# Altium footprint library ref-packages-longpad.PCBLIB: 1527 footprints (part 78 of 103) (continued)
## SQFP-S-20X20-192 [mm] (continued)
Top Overlay:
  circle w0.254: c-8.5,-8.5 r0.75
  lines w0.203: -9.72,-9.71 9.71,-9.71 9.71,9.71 -9.72,9.71 -9.72,-9.71
Mechanical 16:
  drawing of 196 lines, arcs and shapes, not listed
Mechanical 27:
  lines w0.2: -11.9,-11.9 -11.9,11.9 11.9,11.9 11.9,-11.9 -11.9,-11.9

## SQFP-S-20X20-248 [mm]
pads (248):
  rect 0.17x1.6 smd: 1(-9.15,-10.45) 2(-8.85,-10.45) 3(-8.55,-10.45) 4(-8.25,-10.45) 5(-7.95,-10.45) 6(-7.65,-10.45) 7(-7.35,-10.45) 8(-7.05,-10.45) 9(-6.75,-10.45) 10(-6.45,-10.45) 11(-6.15,-10.45) 12(-5.85,-10.45) 13(-5.55,-10.45) 14(-5.25,-10.45) 15(-4.95,-10.45) 16(-4.65,-10.45) 17(-4.35,-10.45) 18(-4.05,-10.45) 19(-3.75,-10.45) 20(-3.45,-10.45) 21(-3.15,-10.45) 22(-2.85,-10.45) 23(-2.55,-10.45) 24(-2.25,-10.45) 25(-1.95,-10.45) 26(-1.65,-10.45) 27(-1.35,-10.45) 28(-1.05,-10.45) 29(-0.75,-10.45) 30(-0.45,-10.45) 31(-0.15,-10.45) 32(0.15,-10.45) 33(0.45,-10.45) 34(0.75,-10.45) 35(1.05,-10.45) 36(1.35,-10.45) 37(1.65,-10.45) 38(1.95,-10.45) 39(2.25,-10.45) 40(2.55,-10.45) 41(2.85,-10.45) 42(3.15,-10.45) 43(3.45,-10.45) 44(3.75,-10.45) 45(4.05,-10.45) 46(4.35,-10.45) 47(4.65,-10.45) 48(4.95,-10.45) 49(5.25,-10.45) 50(5.55,-10.45) 51(5.85,-10.45) 52(6.15,-10.45) 53(6.45,-10.45) 54(6.75,-10.45) 55(7.05,-10.45) 56(7.35,-10.45) 57(7.65,-10.45) 58(7.95,-10.45) 59(8.25,-10.45) 60(8.55,-10.45) 61(8.85,-10.45) 62(9.15,-10.45) 125(9.15,10.45) 126(8.85,10.45) 127(8.55,10.45) 128(8.25,10.45) 129(7.95,10.45) 130(7.65,10.45) 131(7.35,10.45) 132(7.05,10.45) 133(6.75,10.45) 134(6.45,10.45) 135(6.15,10.45) 136(5.85,10.45) 137(5.55,10.45) 138(5.25,10.45) 139(4.95,10.45) 140(4.65,10.45) 141(4.35,10.45) 142(4.05,10.45) 143(3.75,10.45) 144(3.45,10.45) 145(3.15,10.45) 146(2.85,10.45) 147(2.55,10.45) 148(2.25,10.45) 149(1.95,10.45) 150(1.65,10.45) 151(1.35,10.45) 152(1.05,10.45) 153(0.75,10.45) 154(0.45,10.45) 155(0.15,10.45) 156(-0.15,10.45) 157(-0.45,10.45) 158(-0.75,10.45) 159(-1.05,10.45) 160(-1.35,10.45) 161(-1.65,10.45) 162(-1.95,10.45) 163(-2.25,10.45) 164(-2.55,10.45) 165(-2.85,10.45) 166(-3.15,10.45) 167(-3.45,10.45) 168(-3.75,10.45) 169(-4.05,10.45) 170(-4.35,10.45) 171(-4.65,10.45) 172(-4.95,10.45) 173(-5.25,10.45) 174(-5.55,10.45) 175(-5.85,10.45) 176(-6.15,10.45) 177(-6.45,10.45) 178(-6.75,10.45) 179(-7.05,10.45) 180(-7.35,10.45) 181(-7.65,10.45) 182(-7.95,10.45) 183(-8.25,10.45) 184(-8.55,10.45) 185(-8.85,10.45) 186(-9.15,10.45)
  rect 1.6x0.17 smd: 63(10.45,-9.15) 64(10.45,-8.85) 65(10.45,-8.55) 66(10.45,-8.25) 67(10.45,-7.95) 68(10.45,-7.65) 69(10.45,-7.35) 70(10.45,-7.05) 71(10.45,-6.75) 72(10.45,-6.45) 73(10.45,-6.15) 74(10.45,-5.85) 75(10.45,-5.55) 76(10.45,-5.25) 77(10.45,-4.95) 78(10.45,-4.65) 79(10.45,-4.35) 80(10.45,-4.05) 81(10.45,-3.75) 82(10.45,-3.45) 83(10.45,-3.15) 84(10.45,-2.85) 85(10.45,-2.55) 86(10.45,-2.25) 87(10.45,-1.95) 88(10.45,-1.65) 89(10.45,-1.35) 90(10.45,-1.05) 91(10.45,-0.75) 92(10.45,-0.45) 93(10.45,-0.15) 94(10.45,0.15) 95(10.45,0.45) 96(10.45,0.75) 97(10.45,1.05) 98(10.45,1.35) 99(10.45,1.65) 100(10.45,1.95) 101(10.45,2.25) 102(10.45,2.55) 103(10.45,2.85) 104(10.45,3.15) 105(10.45,3.45) 106(10.45,3.75) 107(10.45,4.05) 108(10.45,4.35) 109(10.45,4.65) 110(10.45,4.95) 111(10.45,5.25) 112(10.45,5.55) 113(10.45,5.85) 114(10.45,6.15) 115(10.45,6.45) 116(10.45,6.75) 117(10.45,7.05) 118(10.45,7.35) 119(10.45,7.65) 120(10.45,7.95) 121(10.45,8.25) 122(10.45,8.55) 123(10.45,8.85) 124(10.45,9.15) 187(-10.45,9.15) 188(-10.45,8.85) 189(-10.45,8.55) 190(-10.45,8.25) 191(-10.45,7.95) 192(-10.45,7.65) 193(-10.45,7.35) 194(-10.45,7.05) 195(-10.45,6.75) 196(-10.45,6.45) 197(-10.45,6.15) 198(-10.45,5.85) 199(-10.45,5.55) 200(-10.45,5.25) 201(-10.45,4.95) 202(-10.45,4.65) 203(-10.45,4.35) 204(-10.45,4.05) 205(-10.45,3.75) 206(-10.45,3.45) 207(-10.45,3.15) 208(-10.45,2.85) 209(-10.45,2.55) 210(-10.45,2.25) 211(-10.45,1.95) 212(-10.45,1.65) 213(-10.45,1.35) 214(-10.45,1.05) 215(-10.45,0.75) 216(-10.45,0.45) 217(-10.45,0.15) 218(-10.45,-0.15) 219(-10.45,-0.45) 220(-10.45,-0.75) 221(-10.45,-1.05) 222(-10.45,-1.35) 223(-10.45,-1.65) 224(-10.45,-1.95) 225(-10.45,-2.25) 226(-10.45,-2.55) 227(-10.45,-2.85) 228(-10.45,-3.15) 229(-10.45,-3.45) 230(-10.45,-3.75) 231(-10.45,-4.05) 232(-10.45,-4.35) 233(-10.45,-4.65) 234(-10.45,-4.95) 235(-10.45,-5.25) 236(-10.45,-5.55) 237(-10.45,-5.85) 238(-10.45,-6.15) 239(-10.45,-6.45) 240(-10.45,-6.75) 241(-10.45,-7.05) 242(-10.45,-7.35) 243(-10.45,-7.65) 244(-10.45,-7.95) 245(-10.45,-8.25) 246(-10.45,-8.55) 247(-10.45,-8.85) 248(-10.45,-9.15)
Top Overlay:
  circle w0.254: c-8.5,-8.5 r0.75
  lines w0.203: -9.72,-9.71 9.71,-9.71 9.71,9.71 -9.72,9.71 -9.72,-9.71
Mechanical 16:
  drawing of 252 lines, arcs and shapes, not listed
Mechanical 27:
  lines w0.2: -11.9,-11.9 -11.9,11.9 11.9,11.9 11.9,-11.9 -11.9,-11.9

## SQFP-S-20X20-256 [mm]
pads (256):
  rect 0.17x1.6 smd: 1(-9.45,-10.6) 2(-9.15,-10.6) 3(-8.85,-10.6) 4(-8.55,-10.6) 5(-8.25,-10.6) 6(-7.95,-10.6) 7(-7.65,-10.6) 8(-7.35,-10.6) 9(-7.05,-10.6) 10(-6.75,-10.6) 11(-6.45,-10.6) 12(-6.15,-10.6) 13(-5.85,-10.6) 14(-5.55,-10.6) 15(-5.25,-10.6) 16(-4.95,-10.6) 17(-4.65,-10.6) 18(-4.35,-10.6) 19(-4.05,-10.6) 20(-3.75,-10.6) 21(-3.45,-10.6) 22(-3.15,-10.6) 23(-2.85,-10.6) 24(-2.55,-10.6) 25(-2.25,-10.6) 26(-1.95,-10.6) 27(-1.65,-10.6) 28(-1.35,-10.6) 29(-1.05,-10.6) 30(-0.75,-10.6) 31(-0.45,-10.6) 32(-0.15,-10.6) 33(0.15,-10.6) 34(0.45,-10.6) 35(0.75,-10.6) 36(1.05,-10.6) 37(1.35,-10.6) 38(1.65,-10.6) 39(1.95,-10.6) 40(2.25,-10.6) 41(2.55,-10.6) 42(2.85,-10.6) 43(3.15,-10.6) 44(3.45,-10.6) 45(3.75,-10.6) 46(4.05,-10.6) 47(4.35,-10.6) 48(4.65,-10.6) 49(4.95,-10.6) 50(5.25,-10.6) 51(5.55,-10.6) 52(5.85,-10.6) 53(6.15,-10.6) 54(6.45,-10.6) 55(6.75,-10.6) 56(7.05,-10.6) 57(7.35,-10.6) 58(7.65,-10.6) 59(7.95,-10.6) 60(8.25,-10.6) 61(8.55,-10.6) 62(8.85,-10.6) 63(9.15,-10.6) 64(9.45,-10.6) 129(9.45,10.6) 130(9.15,10.6) 131(8.85,10.6) 132(8.55,10.6) 133(8.25,10.6) 134(7.95,10.6) 135(7.65,10.6) 136(7.35,10.6) 137(7.05,10.6) 138(6.75,10.6) 139(6.45,10.6) 140(6.15,10.6) 141(5.85,10.6) 142(5.55,10.6) 143(5.25,10.6) 144(4.95,10.6) 145(4.65,10.6) 146(4.35,10.6) 147(4.05,10.6) 148(3.75,10.6) 149(3.45,10.6) 150(3.15,10.6) 151(2.85,10.6) 152(2.55,10.6) 153(2.25,10.6) 154(1.95,10.6) 155(1.65,10.6) 156(1.35,10.6) 157(1.05,10.6) 158(0.75,10.6) 159(0.45,10.6) 160(0.15,10.6) 161(-0.15,10.6) 162(-0.45,10.6) 163(-0.75,10.6) 164(-1.05,10.6) 165(-1.35,10.6) 166(-1.65,10.6) 167(-1.95,10.6) 168(-2.25,10.6) 169(-2.55,10.6) 170(-2.85,10.6) 171(-3.15,10.6) 172(-3.45,10.6) 173(-3.75,10.6) 174(-4.05,10.6) 175(-4.35,10.6) 176(-4.65,10.6) 177(-4.95,10.6) 178(-5.25,10.6) 179(-5.55,10.6) 180(-5.85,10.6) 181(-6.15,10.6) 182(-6.45,10.6) 183(-6.75,10.6) 184(-7.05,10.6) 185(-7.35,10.6) 186(-7.65,10.6) 187(-7.95,10.6) 188(-8.25,10.6) 189(-8.55,10.6) 190(-8.85,10.6) 191(-9.15,10.6) 192(-9.45,10.6)
  rect 1.6x0.17 smd: 65(10.6,-9.45) 66(10.6,-9.15) 67(10.6,-8.85) 68(10.6,-8.55) 69(10.6,-8.25) 70(10.6,-7.95) 71(10.6,-7.65) 72(10.6,-7.35) 73(10.6,-7.05) 74(10.6,-6.75) 75(10.6,-6.45) 76(10.6,-6.15) 77(10.6,-5.85) 78(10.6,-5.55) 79(10.6,-5.25) 80(10.6,-4.95) 81(10.6,-4.65) 82(10.6,-4.35) 83(10.6,-4.05) 84(10.6,-3.75) 85(10.6,-3.45) 86(10.6,-3.15) 87(10.6,-2.85) 88(10.6,-2.55) 89(10.6,-2.25) 90(10.6,-1.95) 91(10.6,-1.65) 92(10.6,-1.35) 93(10.6,-1.05) 94(10.6,-0.75) 95(10.6,-0.45) 96(10.6,-0.15) 97(10.6,0.15) 98(10.6,0.45) 99(10.6,0.75) 100(10.6,1.05) 101(10.6,1.35) 102(10.6,1.65) 103(10.6,1.95) 104(10.6,2.25) 105(10.6,2.55) 106(10.6,2.85) 107(10.6,3.15) 108(10.6,3.45) 109(10.6,3.75) 110(10.6,4.05) 111(10.6,4.35) 112(10.6,4.65) 113(10.6,4.95) 114(10.6,5.25) 115(10.6,5.55) 116(10.6,5.85) 117(10.6,6.15) 118(10.6,6.45) 119(10.6,6.75) 120(10.6,7.05) 121(10.6,7.35) 122(10.6,7.65) 123(10.6,7.95) 124(10.6,8.25) 125(10.6,8.55) 126(10.6,8.85) 127(10.6,9.15) 128(10.6,9.45) 193(-10.6,9.45) 194(-10.6,9.15) 195(-10.6,8.85) 196(-10.6,8.55) 197(-10.6,8.25) 198(-10.6,7.95) 199(-10.6,7.65) 200(-10.6,7.35) 201(-10.6,7.05) 202(-10.6,6.75) 203(-10.6,6.45) 204(-10.6,6.15) 205(-10.6,5.85) 206(-10.6,5.55) 207(-10.6,5.25) 208(-10.6,4.95) 209(-10.6,4.65) 210(-10.6,4.35) 211(-10.6,4.05) 212(-10.6,3.75) 213(-10.6,3.45) 214(-10.6,3.15) 215(-10.6,2.85) 216(-10.6,2.55) 217(-10.6,2.25) 218(-10.6,1.95) 219(-10.6,1.65) 220(-10.6,1.35) 221(-10.6,1.05) 222(-10.6,0.75) 223(-10.6,0.45) 224(-10.6,0.15) 225(-10.6,-0.15) 226(-10.6,-0.45) 227(-10.6,-0.75) 228(-10.6,-1.05) 229(-10.6,-1.35) 230(-10.6,-1.65) 231(-10.6,-1.95) 232(-10.6,-2.25) 233(-10.6,-2.55) 234(-10.6,-2.85) 235(-10.6,-3.15) 236(-10.6,-3.45) 237(-10.6,-3.75) 238(-10.6,-4.05) 239(-10.6,-4.35) 240(-10.6,-4.65) 241(-10.6,-4.95) 242(-10.6,-5.25) 243(-10.6,-5.55) 244(-10.6,-5.85) 245(-10.6,-6.15) 246(-10.6,-6.45) 247(-10.6,-6.75) 248(-10.6,-7.05) 249(-10.6,-7.35) 250(-10.6,-7.65) 251(-10.6,-7.95) 252(-10.6,-8.25) 253(-10.6,-8.55) 254(-10.6,-8.85) 255(-10.6,-9.15) 256(-10.6,-9.45)
Top Overlay:
  circle w0.254: c-8.5,-8.5 r0.75
  lines w0.203: -9.72,-9.71 9.71,-9.71 9.71,9.71 -9.72,9.71 -9.72,-9.71
Mechanical 16:
  drawing of 260 lines, arcs and shapes, not listed
Mechanical 27:
  lines w0.2: -11.9,-11.9 -11.9,11.9 11.9,11.9 11.9,-11.9 -11.9,-11.9

## SQFP-S-24X24-176 [mil]
pads (176):
  rect 11.81x62.99 smd: 1(-423.23,-496.06) 2(-403.54,-496.06) 3(-383.86,-496.06) 4(-364.17,-496.06) 5(-344.49,-496.06) 6(-324.8,-496.06) 7(-305.12,-496.06) 8(-285.43,-496.06) 9(-265.75,-496.06) 10(-246.06,-496.06) 11(-226.38,-496.06) 12(-206.69,-496.06) 13(-187.01,-496.06) 14(-167.32,-496.06) 15(-147.64,-496.06) 16(-127.95,-496.06) 17(-108.27,-496.06) 18(-88.58,-496.06) 19(-68.9,-496.06) 20(-49.21,-496.06) 21(-29.53,-496.06) 22(-9.84,-496.06) 23(9.84,-496.06) 24(29.53,-496.06) 25(49.21,-496.06) 26(68.9,-496.06) 27(88.58,-496.06) 28(108.27,-496.06) 29(127.95,-496.06) 30(147.64,-496.06) 31(167.32,-496.06) 32(187.01,-496.06) 33(206.69,-496.06) 34(226.38,-496.06) 35(246.06,-496.06) 36(265.75,-496.06) 37(285.43,-496.06) 38(305.12,-496.06) 39(324.8,-496.06) 40(344.49,-496.06) 41(364.17,-496.06) 42(383.86,-496.06) 43(403.54,-496.06) 44(423.23,-496.06) 89(423.23,496.06) 90(403.54,496.06) 91(383.86,496.06) 92(364.17,496.06) 93(344.49,496.06) 94(324.8,496.06) 95(305.12,496.06) 96(285.43,496.06) 97(265.75,496.06) 98(246.06,496.06) 99(226.38,496.06) 100(206.69,496.06) 101(187.01,496.06) 102(167.32,496.06) 103(147.64,496.06) 104(127.95,496.06) 105(108.27,496.06) 106(88.58,496.06) 107(68.9,496.06) 108(49.21,496.06) 109(29.53,496.06) 110(9.84,496.06) 111(-9.84,496.06) 112(-29.53,496.06) 113(-49.21,496.06) 114(-68.9,496.06) 115(-88.58,496.06) 116(-108.27,496.06) 117(-127.95,496.06) 118(-147.64,496.06) 119(-167.32,496.06) 120(-187.01,496.06) 121(-206.69,496.06) 122(-226.38,496.06) 123(-246.06,496.06) 124(-265.75,496.06) 125(-285.43,496.06) 126(-305.12,496.06) 127(-324.8,496.06) 128(-344.49,496.06) 129(-364.17,496.06) 130(-383.86,496.06) 131(-403.54,496.06) 132(-423.23,496.06)
  rect 62.99x11.81 smd: 45(496.06,-423.23) 46(496.06,-403.54) 47(496.06,-383.86) 48(496.06,-364.17) 49(496.06,-344.49) 50(496.06,-324.8) 51(496.06,-305.12) 52(496.06,-285.43) 53(496.06,-265.75) 54(496.06,-246.06) 55(496.06,-226.38) 56(496.06,-206.69) 57(496.06,-187.01) 58(496.06,-167.32) 59(496.06,-147.64) 60(496.06,-127.95) 61(496.06,-108.27) 62(496.06,-88.58) 63(496.06,-68.9) 64(496.06,-49.21) 65(496.06,-29.53) 66(496.06,-9.84) 67(496.06,9.84) 68(496.06,29.53) 69(496.06,49.21) 70(496.06,68.9) 71(496.06,88.58) 72(496.06,108.27) 73(496.06,127.95) 74(496.06,147.64) 75(496.06,167.32) 76(496.06,187.01) 77(496.06,206.69) 78(496.06,226.38) 79(496.06,246.06) 80(496.06,265.75) 81(496.06,285.43) 82(496.06,305.12) 83(496.06,324.8) 84(496.06,344.49) 85(496.06,364.17) 86(496.06,383.86) 87(496.06,403.54) 88(496.06,423.23) 133(-496.06,423.23) 134(-496.06,403.54) 135(-496.06,383.86) 136(-496.06,364.17) 137(-496.06,344.49) 138(-496.06,324.8) 139(-496.06,305.12) 140(-496.06,285.43) 141(-496.06,265.75) 142(-496.06,246.06) 143(-496.06,226.38) 144(-496.06,206.69) 145(-496.06,187.01) 146(-496.06,167.32) 147(-496.06,147.64) 148(-496.06,127.95) 149(-496.06,108.27) 150(-496.06,88.58) 151(-496.06,68.9) 152(-496.06,49.21) 153(-496.06,29.53) 154(-496.06,9.84) 155(-496.06,-9.84) 156(-496.06,-29.53) 157(-496.06,-49.21) 158(-496.06,-68.9) 159(-496.06,-88.58) 160(-496.06,-108.27) 161(-496.06,-127.95) 162(-496.06,-147.64) 163(-496.06,-167.32) 164(-496.06,-187.01) 165(-496.06,-206.69) 166(-496.06,-226.38) 167(-496.06,-246.06) 168(-496.06,-265.75) 169(-496.06,-285.43) 170(-496.06,-305.12) 171(-496.06,-324.8) 172(-496.06,-344.49) 173(-496.06,-364.17) 174(-496.06,-383.86) 175(-496.06,-403.54) 176(-496.06,-423.23)
Top Overlay:
  circle w10: c-413.39,-413.39 r29.53
  lines w8: -461.42,-461.02 461.02,-461.02 461.02,461.02 -461.42,461.02 -461.42,-461.02
Mechanical 16:
  drawing of 180 lines, arcs and shapes, not listed
Mechanical 27:
  lines w7.87: -547.24,-527.56 -547.24,547.24 547.24,547.24 547.24,-527.56 -547.24,-527.56

## SQFP-S-24X24-184 [mil]
pads (184):
  rect 11.81x62.99 smd: 1(-442.91,-496.06) 2(-423.23,-496.06) 3(-403.54,-496.06) 4(-383.86,-496.06) 5(-364.17,-496.06) 6(-344.49,-496.06) 7(-324.8,-496.06) 8(-305.12,-496.06) 9(-285.43,-496.06) 10(-265.75,-496.06) 11(-246.06,-496.06) 12(-226.38,-496.06) 13(-206.69,-496.06) 14(-187.01,-496.06) 15(-167.32,-496.06) 16(-147.64,-496.06) 17(-127.95,-496.06) 18(-108.27,-496.06) 19(-88.58,-496.06) 20(-68.9,-496.06) 21(-49.21,-496.06) 22(-29.53,-496.06) 23(-9.84,-496.06) 24(9.84,-496.06) 25(29.53,-496.06) 26(49.21,-496.06) 27(68.9,-496.06) 28(88.58,-496.06) 29(108.27,-496.06) 30(127.95,-496.06) 31(147.64,-496.06) 32(167.32,-496.06) 33(187.01,-496.06) 34(206.69,-496.06) 35(226.38,-496.06) 36(246.06,-496.06) 37(265.75,-496.06) 38(285.43,-496.06) 39(305.12,-496.06) 40(324.8,-496.06) 41(344.49,-496.06) 42(364.17,-496.06) 43(383.86,-496.06) 44(403.54,-496.06) 45(423.23,-496.06) 46(442.91,-496.06) 93(442.91,496.06) 94(423.23,496.06) 95(403.54,496.06) 96(383.86,496.06) 97(364.17,496.06) 98(344.49,496.06) 99(324.8,496.06) 100(305.12,496.06) 101(285.43,496.06) 102(265.75,496.06) 103(246.06,496.06) 104(226.38,496.06) 105(206.69,496.06) 106(187.01,496.06) 107(167.32,496.06) 108(147.64,496.06) 109(127.95,496.06) 110(108.27,496.06) 111(88.58,496.06) 112(68.9,496.06) 113(49.21,496.06) 114(29.53,496.06) 115(9.84,496.06) 116(-9.84,496.06) 117(-29.53,496.06) 118(-49.21,496.06) 119(-68.9,496.06) 120(-88.58,496.06) 121(-108.27,496.06) 122(-127.95,496.06) 123(-147.64,496.06) 124(-167.32,496.06) 125(-187.01,496.06) 126(-206.69,496.06) 127(-226.38,496.06) 128(-246.06,496.06) 129(-265.75,496.06) 130(-285.43,496.06) 131(-305.12,496.06) 132(-324.8,496.06) 133(-344.49,496.06) 134(-364.17,496.06) 135(-383.86,496.06) 136(-403.54,496.06) 137(-423.23,496.06) 138(-442.91,496.06)
  rect 62.99x11.81 smd: 47(496.06,-442.91) 48(496.06,-423.23) 49(496.06,-403.54) 50(496.06,-383.86) 51(496.06,-364.17) 52(496.06,-344.49) 53(496.06,-324.8) 54(496.06,-305.12) 55(496.06,-285.43) 56(496.06,-265.75) 57(496.06,-246.06) 58(496.06,-226.38) 59(496.06,-206.69) 60(496.06,-187.01) 61(496.06,-167.32) 62(496.06,-147.64) 63(496.06,-127.95) 64(496.06,-108.27) 65(496.06,-88.58) 66(496.06,-68.9) 67(496.06,-49.21) 68(496.06,-29.53) 69(496.06,-9.84) 70(496.06,9.84) 71(496.06,29.53) 72(496.06,49.21) 73(496.06,68.9) 74(496.06,88.58) 75(496.06,108.27) 76(496.06,127.95) 77(496.06,147.64) 78(496.06,167.32) 79(496.06,187.01) 80(496.06,206.69) 81(496.06,226.38) 82(496.06,246.06) 83(496.06,265.75) 84(496.06,285.43) 85(496.06,305.12) 86(496.06,324.8) 87(496.06,344.49) 88(496.06,364.17) 89(496.06,383.86) 90(496.06,403.54) 91(496.06,423.23) 92(496.06,442.91) 139(-496.06,442.91) 140(-496.06,423.23) 141(-496.06,403.54) 142(-496.06,383.86) 143(-496.06,364.17) 144(-496.06,344.49) 145(-496.06,324.8) 146(-496.06,305.12) 147(-496.06,285.43) 148(-496.06,265.75) 149(-496.06,246.06) 150(-496.06,226.38) 151(-496.06,206.69) 152(-496.06,187.01) 153(-496.06,167.32) 154(-496.06,147.64) 155(-496.06,127.95) 156(-496.06,108.27) 157(-496.06,88.58) 158(-496.06,68.9) 159(-496.06,49.21) 160(-496.06,29.53) 161(-496.06,9.84) 162(-496.06,-9.84) 163(-496.06,-29.53) 164(-496.06,-49.21) 165(-496.06,-68.9) 166(-496.06,-88.58) 167(-496.06,-108.27) 168(-496.06,-127.95) 169(-496.06,-147.64) 170(-496.06,-167.32) 171(-496.06,-187.01) 172(-496.06,-206.69) 173(-496.06,-226.38) 174(-496.06,-246.06) 175(-496.06,-265.75) 176(-496.06,-285.43) 177(-496.06,-305.12) 178(-496.06,-324.8) 179(-496.06,-344.49) 180(-496.06,-364.17) 181(-496.06,-383.86) 182(-496.06,-403.54) 183(-496.06,-423.23) 184(-496.06,-442.91)
Top Overlay:
  circle w10: c-413.39,-413.39 r29.53
  lines w8: -461.42,-461.02 461.02,-461.02 461.02,461.02 -461.42,461.02 -461.42,-461.02
Mechanical 16:
  drawing of 188 lines, arcs and shapes, not listed
Mechanical 27:
  lines w7.87: -547.24,-527.56 -547.24,547.24 547.24,547.24 547.24,-527.56 -547.24,-527.56

## SQFP-S-24X24-224 [mm]
pads (224):
  rect 0.25x1.6 smd: 1(-11,-12.6) 2(-10.6,-12.6) 3(-10.2,-12.6) 4(-9.8,-12.6) 5(-9.4,-12.6) 6(-9,-12.6) 7(-8.6,-12.6) 8(-8.2,-12.6) 9(-7.8,-12.6) 10(-7.4,-12.6) 11(-7,-12.6) 12(-6.6,-12.6) 13(-6.2,-12.6) 14(-5.8,-12.6) 15(-5.4,-12.6) 16(-5,-12.6) 17(-4.6,-12.6) 18(-4.2,-12.6) 19(-3.8,-12.6) 20(-3.4,-12.6) 21(-3,-12.6) 22(-2.6,-12.6) 23(-2.2,-12.6) 24(-1.8,-12.6) 25(-1.4,-12.6) 26(-1,-12.6) 27(-0.6,-12.6) 28(-0.2,-12.6) 29(0.2,-12.6) 30(0.6,-12.6) 31(1,-12.6) 32(1.4,-12.6) 33(1.8,-12.6) 34(2.2,-12.6) 35(2.6,-12.6) 36(3,-12.6) 37(3.4,-12.6) 38(3.8,-12.6) 39(4.2,-12.6) 40(4.6,-12.6) 41(5,-12.6) 42(5.4,-12.6) 43(5.8,-12.6) 44(6.2,-12.6) 45(6.6,-12.6) 46(7,-12.6) 47(7.4,-12.6) 48(7.8,-12.6) 49(8.2,-12.6) 50(8.6,-12.6) 51(9,-12.6) 52(9.4,-12.6) 53(9.8,-12.6) 54(10.2,-12.6) 55(10.6,-12.6) 56(11,-12.6) 113(11,12.6) 114(10.6,12.6) 115(10.2,12.6) 116(9.8,12.6) 117(9.4,12.6) 118(9,12.6) 119(8.6,12.6) 120(8.2,12.6) 121(7.8,12.6) 122(7.4,12.6) 123(7,12.6) 124(6.6,12.6) 125(6.2,12.6) 126(5.8,12.6) 127(5.4,12.6) 128(5,12.6) 129(4.6,12.6) 130(4.2,12.6) 131(3.8,12.6) 132(3.4,12.6) 133(3,12.6) 134(2.6,12.6) 135(2.2,12.6) 136(1.8,12.6) 137(1.4,12.6) 138(1,12.6) 139(0.6,12.6) 140(0.2,12.6) 141(-0.2,12.6) 142(-0.6,12.6) 143(-1,12.6) 144(-1.4,12.6) 145(-1.8,12.6) 146(-2.2,12.6) 147(-2.6,12.6) 148(-3,12.6) 149(-3.4,12.6) 150(-3.8,12.6) 151(-4.2,12.6) 152(-4.6,12.6) 153(-5,12.6) 154(-5.4,12.6) 155(-5.8,12.6) 156(-6.2,12.6) 157(-6.6,12.6) 158(-7,12.6) 159(-7.4,12.6) 160(-7.8,12.6) 161(-8.2,12.6) 162(-8.6,12.6) 163(-9,12.6) 164(-9.4,12.6) 165(-9.8,12.6) 166(-10.2,12.6) 167(-10.6,12.6) 168(-11,12.6)
  rect 1.6x0.25 smd: 57(12.6,-11) 58(12.6,-10.6) 59(12.6,-10.2) 60(12.6,-9.8) 61(12.6,-9.4) 62(12.6,-9) 63(12.6,-8.6) 64(12.6,-8.2) 65(12.6,-7.8) 66(12.6,-7.4) 67(12.6,-7) 68(12.6,-6.6) 69(12.6,-6.2) 70(12.6,-5.8) 71(12.6,-5.4) 72(12.6,-5) 73(12.6,-4.6) 74(12.6,-4.2) 75(12.6,-3.8) 76(12.6,-3.4) 77(12.6,-3) 78(12.6,-2.6) 79(12.6,-2.2) 80(12.6,-1.8) 81(12.6,-1.4) 82(12.6,-1) 83(12.6,-0.6) 84(12.6,-0.2) 85(12.6,0.2) 86(12.6,0.6) 87(12.6,1) 88(12.6,1.4) 89(12.6,1.8) 90(12.6,2.2) 91(12.6,2.6) 92(12.6,3) 93(12.6,3.4) 94(12.6,3.8) 95(12.6,4.2) 96(12.6,4.6) 97(12.6,5) 98(12.6,5.4) 99(12.6,5.8) 100(12.6,6.2) 101(12.6,6.6) 102(12.6,7) 103(12.6,7.4) 104(12.6,7.8) 105(12.6,8.2) 106(12.6,8.6) 107(12.6,9) 108(12.6,9.4) 109(12.6,9.8) 110(12.6,10.2) 111(12.6,10.6) 112(12.6,11) 169(-12.6,11) 170(-12.6,10.6) 171(-12.6,10.2) 172(-12.6,9.8) 173(-12.6,9.4) 174(-12.6,9) 175(-12.6,8.6) 176(-12.6,8.2) 177(-12.6,7.8) 178(-12.6,7.4) 179(-12.6,7) 180(-12.6,6.6) 181(-12.6,6.2) 182(-12.6,5.8) 183(-12.6,5.4) 184(-12.6,5) 185(-12.6,4.6) 186(-12.6,4.2) 187(-12.6,3.8) 188(-12.6,3.4) 189(-12.6,3) 190(-12.6,2.6) 191(-12.6,2.2) 192(-12.6,1.8) 193(-12.6,1.4) 194(-12.6,1) 195(-12.6,0.6) 196(-12.6,0.2) 197(-12.6,-0.2) 198(-12.6,-0.6) 199(-12.6,-1) 200(-12.6,-1.4) 201(-12.6,-1.8) 202(-12.6,-2.2) 203(-12.6,-2.6) 204(-12.6,-3) 205(-12.6,-3.4) 206(-12.6,-3.8) 207(-12.6,-4.2) 208(-12.6,-4.6) 209(-12.6,-5) 210(-12.6,-5.4) 211(-12.6,-5.8) 212(-12.6,-6.2) 213(-12.6,-6.6) 214(-12.6,-7) 215(-12.6,-7.4) 216(-12.6,-7.8) 217(-12.6,-8.2) 218(-12.6,-8.6) 219(-12.6,-9) 220(-12.6,-9.4) 221(-12.6,-9.8) 222(-12.6,-10.2) 223(-12.6,-10.6) 224(-12.6,-11)
Top Overlay:
  circle w0.254: c-10.5,-10.5 r0.75
  lines w0.203: -11.72,-11.71 11.71,-11.71 11.71,11.71 -11.72,11.71 -11.72,-11.71
Mechanical 16:
  drawing of 228 lines, arcs and shapes, not listed
Mechanical 27:
  lines w0.2: -13.9,-13.4 -13.9,13.9 13.9,13.9 13.9,-13.4 -13.9,-13.4

## SQFP-S-24X24-232 [mm]
pads (232):
  rect 0.25x1.6 smd: 1(-11.4,-12.6) 2(-11,-12.6) 3(-10.6,-12.6) 4(-10.2,-12.6) 5(-9.8,-12.6) 6(-9.4,-12.6) 7(-9,-12.6) 8(-8.6,-12.6) 9(-8.2,-12.6) 10(-7.8,-12.6) 11(-7.4,-12.6) 12(-7,-12.6) 13(-6.6,-12.6) 14(-6.2,-12.6) 15(-5.8,-12.6) 16(-5.4,-12.6) 17(-5,-12.6) 18(-4.6,-12.6) 19(-4.2,-12.6) 20(-3.8,-12.6) 21(-3.4,-12.6) 22(-3,-12.6) 23(-2.6,-12.6) 24(-2.2,-12.6) 25(-1.8,-12.6) 26(-1.4,-12.6) 27(-1,-12.6) 28(-0.6,-12.6) 29(-0.2,-12.6) 30(0.2,-12.6) 31(0.6,-12.6) 32(1,-12.6) 33(1.4,-12.6) 34(1.8,-12.6) 35(2.2,-12.6) 36(2.6,-12.6) 37(3,-12.6) 38(3.4,-12.6) 39(3.8,-12.6) 40(4.2,-12.6) 41(4.6,-12.6) 42(5,-12.6) 43(5.4,-12.6) 44(5.8,-12.6) 45(6.2,-12.6) 46(6.6,-12.6) 47(7,-12.6) 48(7.4,-12.6) 49(7.8,-12.6) 50(8.2,-12.6) 51(8.6,-12.6) 52(9,-12.6) 53(9.4,-12.6) 54(9.8,-12.6) 55(10.2,-12.6) 56(10.6,-12.6) 57(11,-12.6) 58(11.4,-12.6) 117(11.4,12.6) 118(11,12.6) 119(10.6,12.6) 120(10.2,12.6) 121(9.8,12.6) 122(9.4,12.6) 123(9,12.6) 124(8.6,12.6) 125(8.2,12.6) 126(7.8,12.6) 127(7.4,12.6) 128(7,12.6) 129(6.6,12.6) 130(6.2,12.6) 131(5.8,12.6) 132(5.4,12.6) 133(5,12.6) 134(4.6,12.6) 135(4.2,12.6) 136(3.8,12.6) 137(3.4,12.6) 138(3,12.6) 139(2.6,12.6) 140(2.2,12.6) 141(1.8,12.6) 142(1.4,12.6) 143(1,12.6) 144(0.6,12.6) 145(0.2,12.6) 146(-0.2,12.6) 147(-0.6,12.6) 148(-1,12.6) 149(-1.4,12.6) 150(-1.8,12.6) 151(-2.2,12.6) 152(-2.6,12.6) 153(-3,12.6) 154(-3.4,12.6) 155(-3.8,12.6) 156(-4.2,12.6) 157(-4.6,12.6) 158(-5,12.6) 159(-5.4,12.6) 160(-5.8,12.6) 161(-6.2,12.6) 162(-6.6,12.6) 163(-7,12.6) 164(-7.4,12.6) 165(-7.8,12.6) 166(-8.2,12.6) 167(-8.6,12.6) 168(-9,12.6) 169(-9.4,12.6) 170(-9.8,12.6) 171(-10.2,12.6) 172(-10.6,12.6) 173(-11,12.6) 174(-11.4,12.6)
  rect 1.6x0.25 smd: 59(12.6,-11.4) 60(12.6,-11) 61(12.6,-10.6) 62(12.6,-10.2) 63(12.6,-9.8) 64(12.6,-9.4) 65(12.6,-9) 66(12.6,-8.6) 67(12.6,-8.2) 68(12.6,-7.8) 69(12.6,-7.4) 70(12.6,-7) 71(12.6,-6.6) 72(12.6,-6.2) 73(12.6,-5.8) 74(12.6,-5.4) 75(12.6,-5) 76(12.6,-4.6) 77(12.6,-4.2) 78(12.6,-3.8) 79(12.6,-3.4) 80(12.6,-3) 81(12.6,-2.6) 82(12.6,-2.2) 83(12.6,-1.8) 84(12.6,-1.4) 85(12.6,-1) 86(12.6,-0.6) 87(12.6,-0.2) 88(12.6,0.2) 89(12.6,0.6) 90(12.6,1) 91(12.6,1.4) 92(12.6,1.8) 93(12.6,2.2) 94(12.6,2.6) 95(12.6,3) 96(12.6,3.4) 97(12.6,3.8) 98(12.6,4.2) 99(12.6,4.6) 100(12.6,5) 101(12.6,5.4) 102(12.6,5.8) 103(12.6,6.2) 104(12.6,6.6) 105(12.6,7) 106(12.6,7.4) 107(12.6,7.8) 108(12.6,8.2) 109(12.6,8.6) 110(12.6,9) 111(12.6,9.4) 112(12.6,9.8) 113(12.6,10.2) 114(12.6,10.6) 115(12.6,11) 116(12.6,11.4) 175(-12.6,11.4) 176(-12.6,11) 177(-12.6,10.6) 178(-12.6,10.2) 179(-12.6,9.8) 180(-12.6,9.4) 181(-12.6,9) 182(-12.6,8.6) 183(-12.6,8.2) 184(-12.6,7.8) 185(-12.6,7.4) 186(-12.6,7) 187(-12.6,6.6) 188(-12.6,6.2) 189(-12.6,5.8) 190(-12.6,5.4) 191(-12.6,5) 192(-12.6,4.6) 193(-12.6,4.2) 194(-12.6,3.8) 195(-12.6,3.4) 196(-12.6,3) 197(-12.6,2.6) 198(-12.6,2.2) 199(-12.6,1.8) 200(-12.6,1.4) 201(-12.6,1) 202(-12.6,0.6) 203(-12.6,0.2) 204(-12.6,-0.2) 205(-12.6,-0.6) 206(-12.6,-1) 207(-12.6,-1.4) 208(-12.6,-1.8) 209(-12.6,-2.2) 210(-12.6,-2.6) 211(-12.6,-3) 212(-12.6,-3.4) 213(-12.6,-3.8) 214(-12.6,-4.2) 215(-12.6,-4.6) 216(-12.6,-5) 217(-12.6,-5.4) 218(-12.6,-5.8) 219(-12.6,-6.2) 220(-12.6,-6.6) 221(-12.6,-7) 222(-12.6,-7.4) 223(-12.6,-7.8) 224(-12.6,-8.2) 225(-12.6,-8.6) 226(-12.6,-9) 227(-12.6,-9.4) 228(-12.6,-9.8) 229(-12.6,-10.2) 230(-12.6,-10.6) 231(-12.6,-11) 232(-12.6,-11.4)
Top Overlay:
  circle w0.254: c-10.5,-10.5 r0.75
  lines w0.203: -11.72,-11.71 11.71,-11.71 11.71,11.71 -11.72,11.71 -11.72,-11.71
Mechanical 16:
  drawing of 236 lines, arcs and shapes, not listed
Mechanical 27:
  lines w0.2: -13.9,-13.4 -13.9,13.9 13.9,13.9 13.9,-13.4 -13.9,-13.4